# Altium footprint library tinyCamera.PcbLib: 101 footprints (part 7 of 7)
Each footprint in its own frame and in the unit in brackets; x right, y up, seen from the top. Pads: shape width x height; smd on the part's side, far side on the other; paste and mask are expansions set on the pad; w line width, h text height; cw(c..) or ccw(c..) is an arc to the next point about the centre after c.
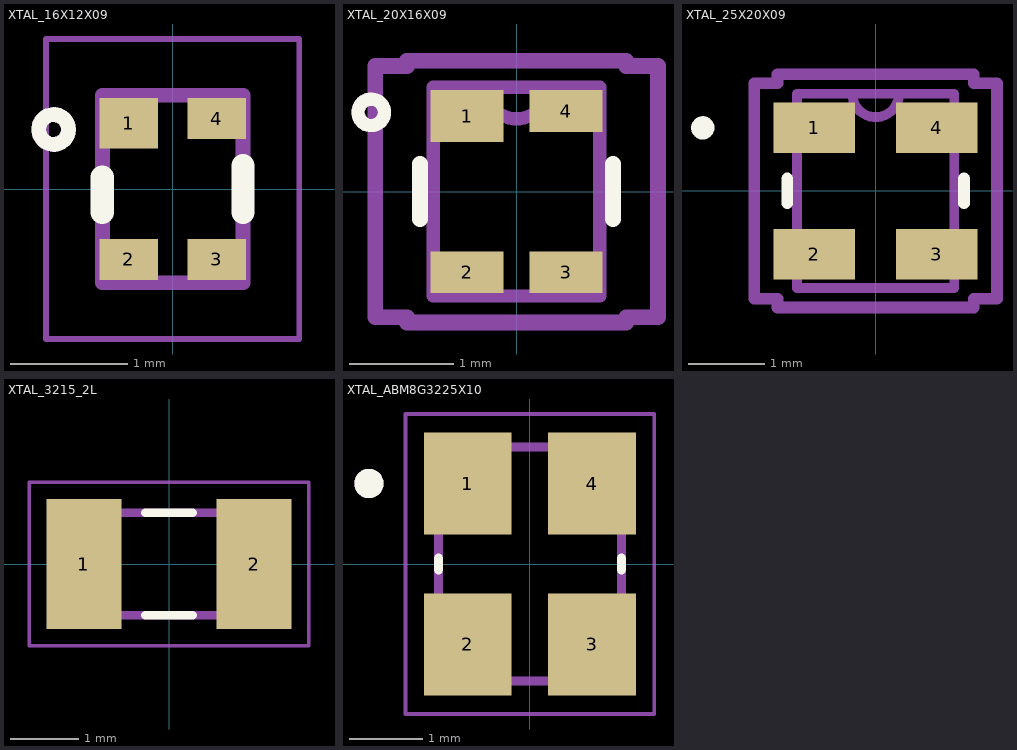
[diagram p6: the footprints below, top view; thin cyan lines are the x and y axes]

## XTAL_16X12X09 [mm]
pads (4):
  rect 0.5x0.43 smd mask+0.05: 1(-0.375,0.56)
  rect 0.5x0.35 smd mask+0.05: 2(-0.375,-0.6) 3(0.375,-0.6) 4(0.375,0.6)
Top Overlay:
  circle w0.127: c-1.016,0.508 r0.127
  lines w0.2: -0.6,-0.2 -0.6,0.1 ; 0.6,-0.2 0.6,0.2
Mechanical 13:
  circle w0.127: c-1.016,0.508 r0.127
  lines w0.127: -0.6,-0.8 0.6,-0.8 0.6,0.8 -0.6,0.8 -0.6,-0.8
  text ".Designator" at 0,-0.381 h1.27
Mechanical 15:
  lines w0.05: -1.08,-1.28 1.08,-1.28 1.08,1.28 -1.08,1.28 -1.08,-1.28
3D body "AMPMGFB-26.0000T.stp": height 0.99, standoff 0, extent -0.6,-0.8 0.6,0.8

## XTAL_20X16X09 [mm]
pads (4):
  rect 0.7x0.5 smd paste+0 mask+0.05: 1(-0.475,0.725)
  rect 0.7x0.4 smd paste+0 mask+0.05: 2(-0.475,-0.775) 3(0.475,-0.775) 4(0.475,0.775)
Top Overlay:
  circle w0.127: c-1.397,0.762 r0.127
  lines w0.152: -0.927,-0.264 -0.927,0.264 ; 0.927,-0.264 0.927,0.264
Mechanical 13:
  circle w0.127: c-1.397,0.762 r0.127
  lines w0.127: -0.305,1.003 ccw(c0,1.003) 0.305,1.003 ; -0.8,-1.003 0.8,-1.003 0.8,1.003 -0.8,1.003 -0.8,-1.003
  text ".Designator" at -0.139,-0.319 h1.27
Mechanical 15:
  lines w0.152: -1.359,-1.206 -1.359,1.206 -1.054,1.206 -1.054,1.257 1.054,1.257 1.054,1.206 1.359,1.206 1.359,-1.206 1.054,-1.206 1.054,-1.257 -1.054,-1.257 -1.054,-1.206 -1.359,-1.206
3D body: height 0.25, standoff 0, extent 0,0 0.254,0.254
3D body "AMPMAFB-12.0000T.stp": height 0.99, standoff 0, extent -0.8,-1 0.8,1

## XTAL_25X20X09 [mil]
pads (4):
  rect 42x26 smd paste+0 mask+0: 1(-31.5,32.48) 2(-31.5,-32.48) 3(31.5,-32.48) 4(31.5,32.48)
Top Overlay:
  circle w6: c-88.98,32.48 r3
  lines w6: -45.5,-6.38 -45.5,6.38 ; 45.5,-6.38 45.5,6.38
Mechanical 13:
  lines w5: -12,50 ccw(c0,50) 12,50 ; -40.5,-50 -40.5,50 40.5,50 40.5,-50 -40.5,-50
  text ".Designator" at -7.46,-14.21 h50
Mechanical 15:
  lines w6: -62.5,-55.48 -50.5,-55.48 -50.5,-60 50.5,-60 50.5,-55.48 62.5,-55.48 62.5,55.48 50.5,55.48 50.5,60 -50.5,60 -50.5,55.48 -62.5,55.48 -62.5,-55.48
3D body "CDFN4_2P5X2_MCH.step": height 35.12, standoff 0, extent -40.51,-50 40.52,50

## XTAL_3215_2L [mm]
pads (2):
  rect 1.1x1.9 smd: 1(-1.25,0) 2(1.25,0)
Top Overlay:
  lines w0.127: -0.35,-0.75 0.35,-0.75 ; -0.35,0.75 0.35,0.75
Mechanical 13:
  lines w0.127: -1.6,-0.75 -1.6,0.75 ; -1.6,-0.75 1.6,-0.75 ; -1.6,-0.75 1.6,-0.75 ; -1.6,-0.75 -1.6,0.75 ; -1.6,0.75 1.6,0.75 ; -1.6,0.75 1.6,0.75 ; 1.6,-0.75 1.6,0.75 ; 1.6,-0.75 1.6,0.75
  text ".Designator" at -1.295,-0.508 h1.27
Mechanical 15:
  lines w0.05: -2.05,-1.2 -2.05,1.2 2.05,1.2 2.05,-1.2 -2.05,-1.2
3D body "User Library-Crystal FC-135.STEP": height 0.8, standoff 0, extent -1.6,-0.75 1.6,0.75

## XTAL_ABM8G3225X10 [mm]
height 1
pads (4):
  rect 1.2x1.4 smd: 1(-0.85,1.1) 2(-0.85,-1.1) 3(0.85,-1.1) 4(0.85,1.1)
Top Overlay:
  circle w0.2: c-2.2,1.1 r0.1
  lines w0.127: -1.25,-0.08 -1.25,0.08 ; 1.25,-0.08 1.25,0.08
Mechanical 13:
  circle w0.2: c-2.2,1.1 r0.1
  lines w0.127: -1.25,-1.6 -1.25,1.6 1.25,1.6 1.25,-1.6 -1.25,-1.6
  text ".Designator" at -0.663,-0.364 h1.27
Mechanical 15:
  lines w0.05: -1.7,-2.05 -1.7,2.05 1.7,2.05 1.7,-2.05 -1.7,-2.05
3D body "step_temp.STEP": height 0.99, standoff 0, extent -1.245,-1.6 1.245,1.6